# Altium footprint library d1_PcbLib.PcbLib: 266 footprints (part 14 of 17)
Each footprint in its own frame and in the unit in brackets; x right, y up, seen from the top. Pads: shape width x height; smd on the part's side, far side on the other; paste and mask are expansions set on the pad; w line width, h text height; cw(c..) or ccw(c..) is an arc to the next point about the centre after c.
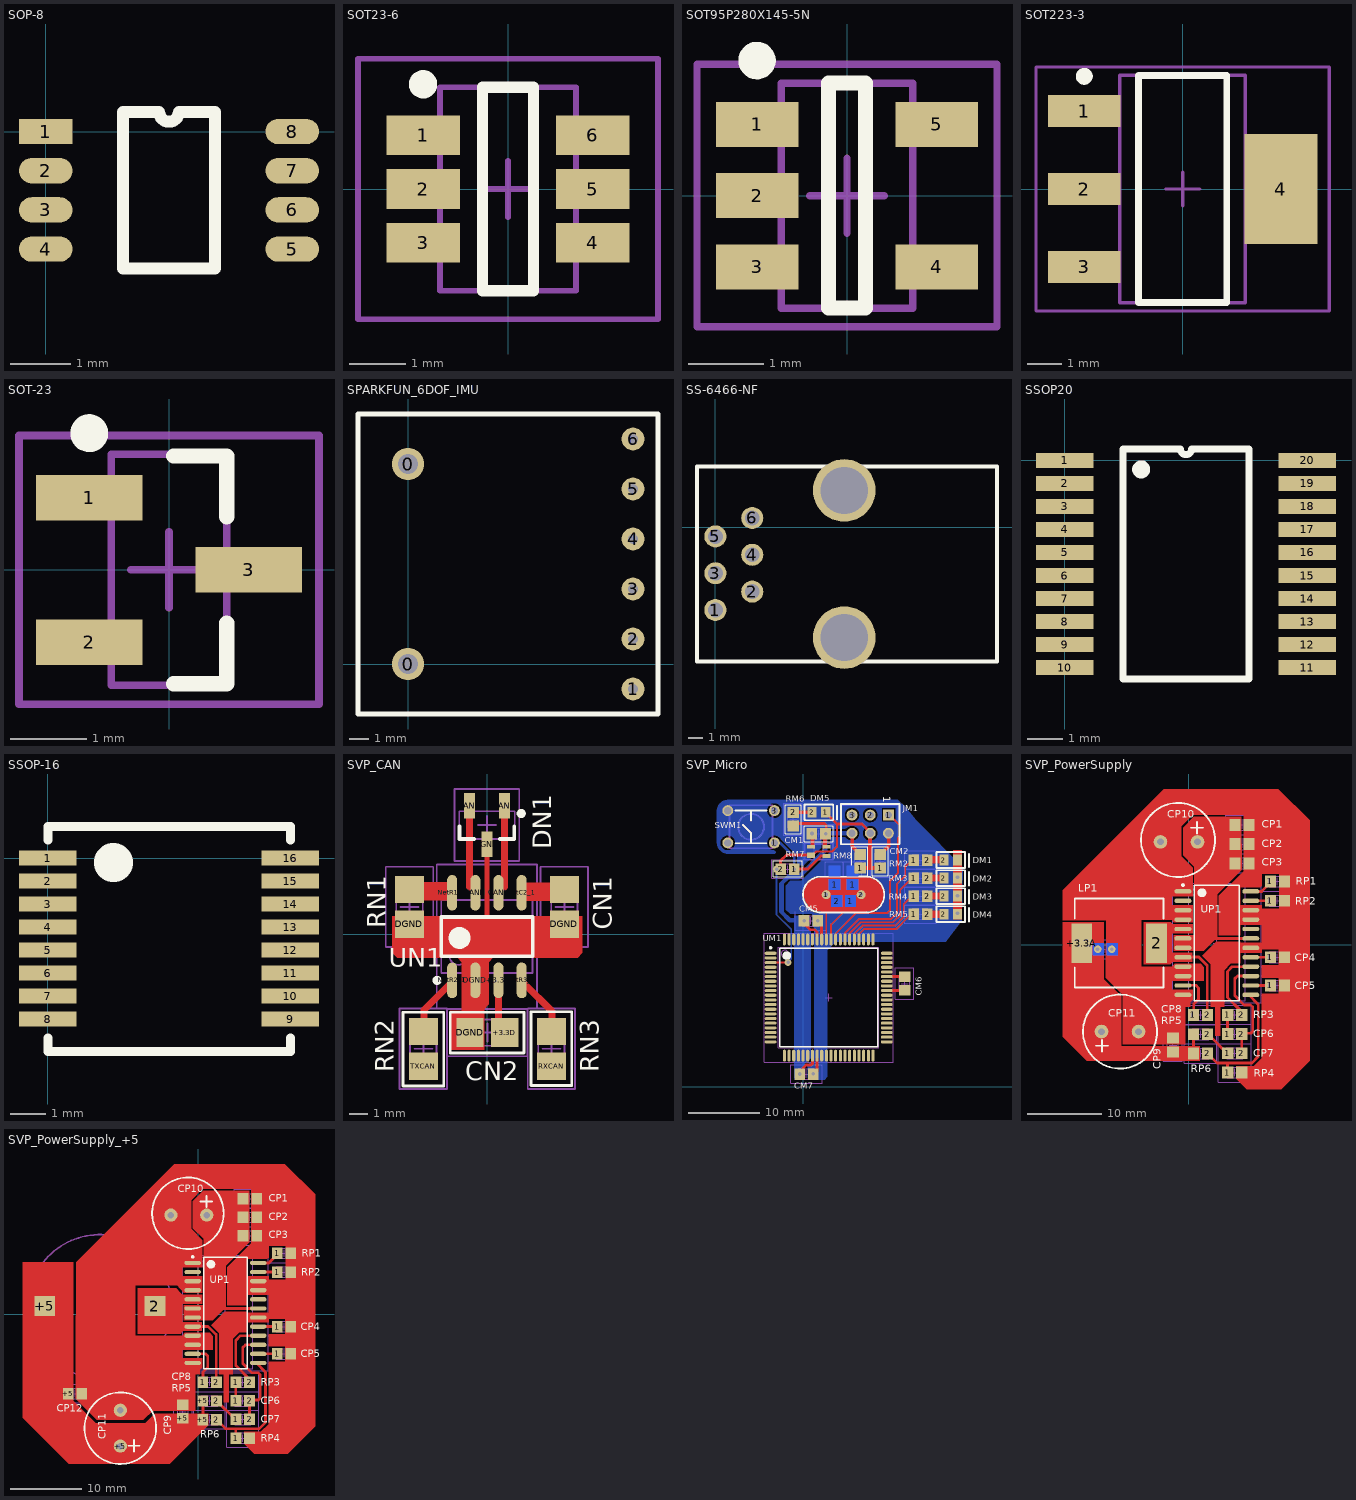
[diagram p13: the footprints below, top view; thin cyan lines are the x and y axes]

## SOP-8 [mm]
pads (8):
  rect 0.889x0.42 smd: 1(0,0)
  oval 0.889x0.42 smd: 2(0,-0.65) 3(0,-1.3) 4(0,-1.95) 5(4.089,-1.95) 6(4.089,-1.3) 7(4.089,-0.65) 8(4.089,0)
Top Overlay:
  lines w0.2: 1.279,-2.275 1.279,0.325 1.882,0.325 ccw(c2.044,0.325) 2.207,0.325 2.81,0.325 2.81,-2.275 1.279,-2.275

## SOT23-6 [mm]
pads (6):
  rect 1.3x0.7 smd: 1(-1.5,0.95) 2(-1.5,0) 3(-1.5,-0.95) 4(1.5,-0.95) 5(1.5,0) 6(1.5,0.95)
Top Overlay:
  circle w0.25: c-1.5,1.85 r0.125
  lines w0.2: -0.45,-1.8 -0.45,1.8 0.45,1.8 0.45,-1.8 -0.45,-1.8
Mechanical 13:
  lines w0.1: -1.2,-1.8 1.2,-1.8 1.2,1.8 -1.2,1.8 -1.2,-1.8
Mechanical 15:
  lines w0.1: -0.5,0 0.5,0 ; 0,-0.5 0,0.5 ; -2.65,-2.3 2.65,-2.3 2.65,2.3 -2.65,2.3 -2.65,-2.3
3D body: height 0, standoff 0, extent -1.2,-1.8 1.2,1.8

## SOT95P280X145-5N [mm] "SOT23, 5-Leads, Body 3.0x3.0mm (max), Pitch 0.95mm, IPC Medium Density"
height 1.45
pads (5):
  rect 1.1x0.6 smd: 1(-1.2,0.95) 2(-1.2,0) 3(-1.2,-0.95) 4(1.2,-0.95) 5(1.2,0.95)
Top Overlay:
  circle w0.25: c-1.2,1.8 r0.125
  lines w0.2: -0.25,-1.5 -0.25,1.5 0.25,1.5 0.25,-1.5 -0.25,-1.5
Mechanical 13:
  lines w0.1: -0.875,-1.5 0.875,-1.5 0.875,1.5 -0.875,1.5 -0.875,-1.5
Mechanical 15:
  lines w0.1: -0.5,0 0.5,0 ; 0,-0.5 0,0.5 ; -2,-1.75 2,-1.75 2,1.75 -2,1.75 -2,-1.75
3D body: height 1.45, standoff 0.05, extent -0.875,-1.5 0.875,1.5

## SOT223-3 [mm] "SOT223, 4-Leads, Body 6.7x7.3mm (max), Pitch 2.30mm, IPC Medium Density"
height 1.8
pads (4):
  rect 2.15x0.95 smd: 1(-2.9,2.3) 2(-2.9,0) 3(-2.9,-2.3)
  rect 2.15x3.25 smd: 4(2.9,0)
Top Overlay:
  circle w0.25: c-2.9,3.325 r0.125
  lines w0.2: -1.3,-3.35 -1.3,3.35 1.3,3.35 1.3,-3.35 -1.3,-3.35
Mechanical 13:
  lines w0.1: -1.85,-3.35 -1.85,3.35 1.85,3.35 1.85,-3.35 -1.85,-3.35
Mechanical 15:
  lines w0.1: -0.5,0 0.5,0 ; 0,-0.5 0,0.5 ; -4.325,-3.6 -4.325,3.6 4.325,3.6 4.325,-3.6 -4.325,-3.6
3D body: height 1.8, standoff 0.02, extent -1.85,-3.35 1.85,3.35

## SOT-23 [mm] "SOT23, 3-Leads, Body 3.0x2.7mm (max), Pitch 0.95mm, IPC Medium Density"
height 1.12
pads (3):
  rect 1.4x0.6 smd: 1(-1.05,0.95) 2(-1.05,-0.95) 3(1.05,0)
Top Overlay:
  circle w0.25: c-1.05,1.8 r0.125
  lines w0.2: 0.06,-1.5 0.76,-1.5 0.76,-0.7 ; 0.06,1.5 0.76,1.5 0.76,0.7
Mechanical 13:
  lines w0.1: -0.76,-1.52 0.76,-1.52 0.76,1.52 -0.76,1.52 -0.76,-1.52
Mechanical 15:
  lines w0.1: -0.5,0 0.5,0 ; 0,-0.5 0,0.5 ; -1.975,-1.77 1.975,-1.77 1.975,1.77 -1.975,1.77 -1.975,-1.77
3D body: height 1.1, standoff 0, extent -1.21,-1.1 0.991,1.1

## SPARKFUN_6DOF_IMU [mm] "SPARKFUN_6DOF_IMU"
pads (8):
  round 1.65 hole 1.02: 0(0,0) 0(0,10.16)
  round 1.16 hole 0.508: 1(11.43,-1.27) 2(11.43,1.27) 3(11.43,3.81) 4(11.43,6.35) 5(11.43,8.89) 6(11.43,11.43)
Top Overlay:
  lines w0.254: -2.54,-2.54 12.7,-2.54 12.7,12.7 -2.54,12.7 -2.54,-2.54
Mechanical 2:
  text ".Designator" at 4.953,10.287 h1.52
3D body: height 2.29, standoff 0, extent -2.413,-2.413 12.573,12.573

## SS-6466-NF [mil]
pads (8):
  round 60 hole 40: 1(0,-225) 2(100,-175) 3(0,-125) 4(100,-75) 5(0,-25) 6(100,25)
  round 170 hole 128: ""(350,-300) ""(350,100)
Top Overlay:
  lines w10: -50,-365 765,-365 765,-100 765,165 -50,165 -50,-365
3D body: height 505, standoff 0, extent -47.5,-365 767.5,165

## SSOP20 [mm]
pads (20):
  rect 1.62x0.42 smd: 1(0,0) 2(0,-0.65) 3(0,-1.3) 4(0,-1.95) 5(0,-2.6) 6(0,-3.25) 7(0,-3.9) 8(0,-4.55) 9(0,-5.2) 10(0,-5.85) 11(6.85,-5.85) 12(6.85,-5.2) 13(6.85,-4.55) 14(6.85,-3.9) 15(6.85,-3.25) 16(6.85,-2.6) 17(6.85,-1.95) 18(6.85,-1.3) 19(6.85,-0.65) 20(6.85,0)
Top Overlay:
  circle w0.254: c2.159,-0.254 r0.127
  lines w0.2: 1.645,-6.175 1.645,0.325 3.263,0.325 ccw(c3.425,0.325) 3.587,0.325 5.205,0.325 5.205,-6.175 1.645,-6.175

## SSOP-16 [mm] "SSOP - 16 Pin"
pads (16):
  rect 1.63x0.42 smd: 1(0,0) 2(0,-0.65) 3(0,-1.3) 4(0,-1.95) 5(0,-2.6) 6(0,-3.25) 7(0,-3.9) 8(0,-4.55) 9(6.85,-4.55) 10(6.85,-3.9) 11(6.85,-3.25) 12(6.85,-2.6) 13(6.85,-1.95) 14(6.85,-1.3) 15(6.85,-0.65) 16(6.85,0)
Top Overlay:
  circle w1: c1.855,-0.127 r0.05
  lines w0.254: 0,-5.08 0,-5.461 6.858,-5.461 6.858,-5.08 ; 0,0.508 0,0.889 6.858,0.889 6.858,0.508

## SVP_CAN [mm]
pads (21):
  oval 0.55x1.95 smd: +3.3D(0.61,-2.527) CANH(-0.66,2.273) CANL(0.61,2.273) DGND(-0.66,-2.527) NetC2_1(1.88,2.273) NetR1_2(-1.93,2.273) NetR2_1(-1.93,-2.527) NetR3_1(1.88,-2.527)
  rect 1.5x1.6 smd: +3.3D(0.95,-5.385) DGND(-0.95,-5.385)
  rect 0.6x1.4 smd: CANH(-0.975,7.028) CANL(0.925,7.028) DGND(-0.025,4.928)
  rect 1.6x1.5 smd: DGND(-4.267,0.549) DGND(4.216,0.549) NetC2_1(4.216,2.449) NetR1_2(-4.267,2.449) NetR2_1(-3.505,-5.324) NetR3_1(3.505,-5.324) RXCAN(3.505,-7.224) TXCAN(-3.505,-7.224)
Top Layer:
  region: -5.207,0.991 5.207,0.991 5.207,-1.016 4.953,-1.295 0.279,-1.295 0.076,-1.524 0.076,-3.835 -0.178,-4.115 -0.178,-6.325 -2.032,-6.35 -2.032,-4.191 -1.397,-4.191 -1.397,-1.524 -1.626,-1.295 -4.928,-1.295 -5.207,-1.016
  lines w0.254: -1.905,-2.718 -1.905,-2.515 ; -0.025,0.61 -0.025,4.928
  lines w0.381: -3.48,-5.309 -3.48,-4.14 -2.057,-2.718 ; -0.975,2.588 -0.975,7.028 ; 0.61,-5.283 0.61,-3.048 ; 0.925,2.588 0.925,7.028 ; 1.981,-2.667 3.531,-4.216 3.531,-5.309
  lines w1.016: -4.47,2.362 -2.184,2.362 ; 2.21,2.337 4.343,2.337
Top Overlay:
  circle w0.25: c1.851,6.613 r0.125
  circle w0.25: c-2.755,-2.527 r0.125
  circle w0.6: c-1.525,-0.202 r0.3
  lines w0.152: -4.623,-8.306 -4.623,-4.267 -2.388,-4.267 -2.388,-8.306 -4.623,-8.306 ; -2.032,-6.502 -2.032,-4.267 2.007,-4.267 2.007,-6.502 -2.032,-6.502 ; 2.388,-8.28 2.388,-4.242 4.623,-4.242 4.623,-8.28 2.388,-8.28
  lines w0.2: -1.525,5.918 -1.525,5.218 -0.725,5.218 ; 0.675,5.218 1.475,5.218 1.475,5.918 ; -2.525,-1.202 2.475,-1.202 2.475,0.948 -2.525,0.948 -2.525,-1.202
  text "DN1" at 3.505,4.648 h1.02
  text "UN1" at -5.41,-1.778 h1.02
  text "CN2" at -1.219,-8.001 h1.02
  text "RN3" at 6.096,-7.569 h1.02
  text "RN2" at -5.131,-7.569 h1.02
  text "CN1" at 6.807,0.254 h1.02
  text "RN1" at -5.563,0.33 h1.02
Mechanical 13:
  circle w0.1: c-1.575,-1.177 r0.5
  lines w0.1: -4.992,0.399 -3.542,0.399 -3.542,2.599 -4.992,2.599 -4.992,0.399 ; -4.23,-7.374 -2.78,-7.374 -2.78,-5.174 -4.23,-5.174 -4.23,-7.374 ; -2.525,-2.127 2.475,-2.127 2.475,1.873 -2.525,1.873 -2.525,-2.127 ; -1.545,5.218 -1.545,6.738 1.495,6.738 1.495,5.218 -1.545,5.218 ; -1.1,-6.11 -1.1,-4.66 1.1,-4.66 1.1,-6.11 -1.1,-6.11 ; 2.78,-7.374 4.23,-7.374 4.23,-5.174 2.78,-5.174 2.78,-7.374 ; 3.491,0.399 4.941,0.399 4.941,2.599 3.491,2.599 3.491,0.399
Mechanical 15:
  lines w0.1: -4.767,1.499 -3.767,1.499 ; -4.267,0.999 -4.267,1.999 ; -4.005,-6.274 -3.005,-6.274 ; -3.505,-6.774 -3.505,-5.774 ; -0.525,-0.127 0.475,-0.127 ; -0.525,5.978 0.475,5.978 ; -0.5,-5.385 0.5,-5.385 ; -0.025,-0.627 -0.025,0.373 ; -0.025,5.478 -0.025,6.478 ; 0,-5.885 0,-4.885 ; 3.005,-6.274 4.005,-6.274 ; 3.505,-6.774 3.505,-5.774 ; 3.716,1.499 4.716,1.499 ; 4.216,0.999 4.216,1.999 ; -5.567,-0.701 -2.967,-0.701 -2.967,3.699 -5.567,3.699 -5.567,-0.701 ; -4.805,-8.474 -2.205,-8.474 -2.205,-4.074 -4.805,-4.074 -4.805,-8.474 ; -2.775,-4.077 2.725,-4.077 2.725,3.823 -2.775,3.823 -2.775,-4.077 ; -2.2,-6.685 -2.2,-4.085 2.2,-4.085 2.2,-6.685 -2.2,-6.685 ; -1.795,4.003 -1.795,7.953 1.745,7.953 1.745,4.003 -1.795,4.003 ; 2.205,-8.474 4.805,-8.474 4.805,-4.074 2.205,-4.074 2.205,-8.474 ; 2.916,-0.701 5.516,-0.701 5.516,3.699 2.916,3.699 2.916,-0.701
3D body: height 1.1, standoff 0, extent -1.125,4.987 1.074,7.188
3D body: height 0.5, standoff -0.01, extent -5.029,-0.025 -3.505,3.023
3D body: height 0.5, standoff -0.01, extent 2.743,-7.798 4.267,-4.75
3D body: height 0.5, standoff -0.01, extent -4.267,-7.798 -2.743,-4.75
3D body: height 1.24, standoff -0.03, extent 3.454,-0.152 4.978,3.15
3D body: height 1.24, standoff -0.03, extent -1.651,-6.147 1.651,-4.623
3D body: height 1.55, standoff 0, extent -2.489,-3.102 2.454,2.898

## SVP_Micro [mil] "Micro, Clock, BDM, Reset, Debug"
pads (136):
  round 60 hole 40: 1(-159,1339) 3(-159,1516.17) DGND(-414.91,1516.17) SW_4(-414.91,1339)
  rect 59.06x62.99 smd: 1(-49.6,1195) 1(605.6,948) 1(605.6,1047) 1(605.6,1146) 1(605.6,1245) 2(-124.4,1195) 2(680.4,948) 2(680.4,1047) 2(680.4,1146) 2(680.4,1245) +3.3D(-20.4,70) +3.3D(3.6,911) +3.3D(121.4,1390) DGND(46.6,1390) DGND(54.4,70) DGND(78.4,911)
  rect 51.18x59.06 smd: 1(122.4,1507) 2(47.6,1507) 2(771.6,948) 2(771.6,1047) 2(771.6,1146) 2(771.6,1245) DGND(846.4,948) DGND(846.4,1047) DGND(846.4,1146) DGND(846.4,1245)
  round 49.21 hole 21.65: 1(125,1055) 2(317.13,1055)
  rect 62.99x59.06 smd far side: 1(171,1110.6) 1(270,1110.6) DGND(171,1185.4) DGND(270,1185.4)
  rect 59.06x62.99 smd far side: 1(258.4,1020) 2(183.6,1020)
  rect 62.99x59.06 smd: 1(311,1200.6) 1(421,1200.6) 2(-56,1506.4) +3.3A(556,529.6) +3.3D(-56,1431.6) +3.3D(311,1275.4) AGND(556,604.4) DGND(421,1275.4)
  rect 60x60 hole 39: 1(467,1492)
  rrect25% 45x30 smd: 2(42,1272)
  round 60 hole 39: 2(367,1492) 3(267,1492) +3.3D(267,1392) BDM_5(367,1392) DGND(467,1392)
  rrect25% 45x20 smd: 3(127,1267) +3.3D(127,1317) DGND(42,1317)
  oval 65x17 smd: 5(-179.9,630.75) 6(-179.9,605.16) 7(-179.9,579.57) 8(-179.9,553.98) 9(-179.9,528.39) 10(-179.9,502.8) 11(-179.9,477.2) 12(-179.9,451.61) 13(-179.9,426.02) 14(-179.9,400.43) 15(-179.9,374.84) 16(-179.9,349.25) 17(-179.9,323.66) 18(-179.9,298.07) 19(-179.9,272.48) 20(-179.9,246.89) 41(457.9,246.89) 42(457.9,272.48) 43(457.9,298.07) 44(457.9,323.66) 45(457.9,349.25) 46(457.9,374.84) 47(457.9,400.43) 48(457.9,426.02) 49(457.9,451.61) 50(457.9,477.2) 51(457.9,502.8) 53(457.9,553.98) 54(457.9,579.57) 56(457.9,630.75) 57(457.9,656.34) 58(457.9,681.93) 59(457.9,707.52) 60(457.9,733.11) +3.3A(457.9,528.39) AGND(457.9,605.16) U_1(-179.9,733.11) U_2(-179.9,707.52) U_3(-179.9,681.93) U_4(-179.9,656.34)
  oval 17x65 smd: 21(-104.11,171.1) 22(-78.52,171.1) 23(-52.93,171.1) 24(-27.34,171.1) 25(-1.75,171.1) 26(23.84,171.1) 29(100.61,171.1) 30(126.2,171.1) 31(151.8,171.1) 32(177.39,171.1) 33(202.98,171.1) 34(228.57,171.1) 35(254.16,171.1) 36(279.75,171.1) 37(305.34,171.1) 38(330.93,171.1) 39(356.52,171.1) 40(382.11,171.1) 61(382.11,808.9) 62(356.52,808.9) 63(330.93,808.9) 64(305.34,808.9) 65(279.75,808.9) 66(254.16,808.9) 67(228.57,808.9) 68(202.98,808.9) 69(177.39,808.9) 70(151.8,808.9) 71(126.2,808.9) 74(49.43,808.9) 75(23.84,808.9) 76(-1.75,808.9) 77(-27.34,808.9) 78(-52.93,808.9) 79(-78.52,808.9) 80(-104.11,808.9) +3.3D(49.43,171.1) +3.3D(75.02,808.9) DGND(75.02,171.1) DGND(100.61,808.9)
via -147,1194 diameter 40 hole 20
via -84,683 diameter 40 hole 20
via 55,72 diameter 40 hole 20
via -20,70 diameter 40 hole 20
via 4,912 diameter 40 hole 20
via 78,912 diameter 40 hole 20
via 122,1389 diameter 40 hole 20
via 47,1391 diameter 40 hole 20
via -50,1195 diameter 40 hole 20
via 846,952 diameter 40 hole 20
via 846,1048 diameter 40 hole 20
via 846,1150 diameter 40 hole 20
Top Layer:
  rectangle: 821,918 872,1300
  pour cut-out: 23,1114 31,1123 37,1128 47,1136 57,1141 68,1146 83,1149 94,1150 352,1150 368,1147 384,1142 397,1135 410,1125 424,1109 434,1091 439,1076 441,1060 441,1048 438,1033 431,1016 423,1002 408,985 395,976 376,967 362,964 345,962 98,962 85,963 75,965 65.87,967.74 56,972 46,977 38,983 29,992 21,1002 12,1015 7,1029 4,1044 3,1056 4,1068 6,1078 9,1090 14,1099 18,1106
  lines w10: -179,683 -83,683 ; 126,822 126,853 126,1054 ; 152,831 152,850 ; 152,851 152,891 316,1055 ; 175,835 175,839 291,955 461,955 476,970 476,1131 520,1175 520,1366 527,1373 527,1439 478,1488 ; 201,831 201,836 ; 228,838 228,833 228,839 228,840 228,843 307,922 482,922 514,954 514,1114 559,1159 559,1207 592,1240 ; 253,833 253,840 253,841 315,903 492,903 532,943 532,1082 587,1137 ; 279,834 279,839 325,885 503,885 551,933 551,1002 601,1052 ; 304,835 305,836 306,836 306,839 333,866 510,866 579,935 585,935 ; 367,1393 367,1397
  lines w12: 52,1273 71,1292 158,1292 184,1318 184,1444
  lines w15: -125,1196 -125,1241 -93,1273 -26,1273 40,1273 ; -51,1196 25,1196 42,1213 ; -43,1446 115,1446 126,1435 126,1399 ; 15,892 15,886 39,862 63,862 75,850 75,826 ; 36.5,1207.5 96,1267 121,1267 ; 100,816 100,906 ; 130,1498 185,1443 321,1443 367,1397 ; 455,605 555,605 ; 456,529 561,529
  lines w16: -2,98 -2,102 15,119 42,119 49,126 49,162
  lines w17: 75,85 75,156
  lines w20: -49,1507 48,1507 ; 50,1320 50,1379 ; 119,1319 119,1380 ; 268,1392 268,1319 312,1275 ; 311,1201 420,1201 ; 366,1203 366,1393 ; 421,1275 468,1322 468,1392
  lines w40: 673,1047 766,1047 ; 676,1146 769,1146 ; 681,1246 774,1246 ; 682,948 775,948
Bottom Layer:
  circle w20: c-415,1516 r50
  circle w20: c367,1392 r50
  circle w20: c367,1492 r50
  circle w20: c267,1492 r50
  circle w20: c-415,1339 r50
  circle w20: c-159,1516 r50
  region: 269,1215 168,1215 168,1156 269,1156
  region: 49,942 49,949 -73,949 -96,972 -96,1105 -71,1130 -11,1130 151,1292 151,1170 110,1170 110,1158 79,1156 54,1150 28,1132 6,1106 -2,1085 -7,1064 -6,1039 -2,1021 6,1004 20,986 35,972 50,961 72,954
  pour cut-out: 421,1114 413,1123 407,1128 397,1136 387,1141 376,1146 361,1149 350,1150 92,1150 76,1147 60,1142 47,1135 34,1125 20,1109 10,1091 5,1076 3,1060 3,1048 6,1033 13,1016 21,1002 36,985 49,976 68,967 82,964 99,962 346,962 359,963 369,965 378.13,967.74 388,972 398,977 406,983 415,992 423,1002 432,1015 437,1029 440,1044 441,1056 440,1068 438,1078 435,1090 430,1099 426,1106
  region: 220,1576 518,1576 558,1538 551,1532 389,1532 380,1540 373,1533 233,1533 219,1519
  region: -475,1337 -438,1378 -408,1382 -381,1376 -365,1330 -378,1306 -404,1297 -434,1293 -418,1279 -159,1279 -197,1307 -202,1336 -201,1365 -180,1380 -153,1382 -131,1376 -125,1359 -112,1347 -34,1269 -34,1223 -26,1216 1,1216 98,1313 98,1368 94,1379.33 94,1405 103,1417 231,1417 234,1433 273,1436 306,1428 311,1389 309,1350 324,1350 324,1429.4 371,1435 415,1430 422,1443 632,1450 558,1538 506,1539 506,1454 429,1454 429,1533 403,1533 408,1494 403,1457 365,1451 328,1457 323,1496 333,1535 302,1535 309,1493 303,1455 266,1452 229,1458 221,1576 -159,1576 -135,1551 -122,1540 -116,1525 -118,1486 -136,1476 -166,1474 -195,1478 -208,1526 -159,1576 -419,1576 -475,1521
  region: 25,46 25,121 60,156 60,873 49,884 49,943 66,954 374,954 402,967 422,984 442,1015 449,1044 450,1071 441,1099 422,1127 400,1144 367,1156 353,1158 110,1158 101,1171 147,1217 147,1369 230,1369 250,1354 383,1354 408,1370 408,1430 422,1450 554,1451 629,1454 874,1205 870,913 781,797 179,797 131,749 131,54 116,39 31,39
  region: -51,46 -45,40 2,40 8,46 8,126 40,158 40,860 32,868 32,938 -51,938
  lines w10: -148,1196 -148,946 -67,865 -67,702 -72,697 -84,697 -84,682 ; 125,1055 125,1066 171,1112 ; 126,1054 132,1054 170,1016 ; 204,1003 208,999 ; 234,996 236,998 248,1010 ; 274,1016 313,1055 317,1055 ; 278,1106 318,1066 318,1056
  lines w15: -163,1340 -129,1340 -50,1261 -50,1194
  lines w20: -158.98,1288.71 cw(c-158.5,1338.7) -117.99,1368.01 ; 230.59,1357.73 ccw(c267,1392) 232.73,1428.41
  lines w25: 6,915 -75,915 -120,960 -120,1116 -84,1152 -26,1152 117,1295 121,1299 121,1388 ; 121,1391 264,1391
Top Overlay:
  circle w9.84: c-179.9,763.62 r4.92
  circle w23.62: c-91.31,720.32 r11.81
  lines w6: -166,1152 -166,1240 -7,1240 -7,1152 -166,1152 ; -100,1390 -100,1549 -12,1549 -12,1390 -100,1390 ; 5,1346 5,1434 164,1434 164,1346 5,1346 ; 266,1159 354,1159 354,1318 266,1318 266,1159 ; 377,1159 465,1159 465,1318 377,1318 377,1159
  lines w7.87: -130.69,220.31 -130.69,759.69 408.69,759.69 408.69,220.31 -130.69,220.31
  lines w10: -371.95,1337.58 -201.95,1337.58 ; -371.95,1517.58 -201.95,1517.58 ; -331.95,1437.58 -286.95,1392.58 -286.95,1337.58 ; -286.95,1462.58 -286.95,1517.58 ; 96,1153.43 348,1153.43 ; 96.06,956.57 cw(c96.06,1055) 96.06,1153.43 ; 97,956.57 346,956.57 ; 185,1467 185,1542 ; 346.06,956.57 ccw(c346.06,1055) 346.06,1153.43 ; 909,908 909,983 ; 909,1007 909,1082 ; 909,1106 909,1181 ; 909,1205 909,1280 ; 6.26,1463.69 163.74,1463.69 163.74,1550.31 120.43,1550.31 49.57,1550.31 6.26,1550.31 6.26,1463.69 ; 207,1332 207,1552 527,1552 527,1332 207,1332 ; 730.26,904.69 887.74,904.69 887.74,991.31 844.43,991.31 773.57,991.31 730.26,991.31 730.26,904.69 ; 730.26,1003.69 887.74,1003.69 887.74,1090.31 844.43,1090.31 773.57,1090.31 730.26,1090.31 730.26,1003.69 ; 730.26,1102.69 887.74,1102.69 887.74,1189.31 844.43,1189.31 773.57,1189.31 730.26,1189.31 730.26,1102.69 ; 730.26,1201.69 730.26,1288.31 773.57,1288.31 844.43,1288.31 887.74,1288.31 887.74,1201.69 730.26,1201.69
  text "SWM1" at -487,1419 h35
  text "UM1" at -222,798 h35
  text "CM7" at -49,-12 h35
  text "CM6" at 649,501 h35
  text "CM5" at -24,960 h35
  text "CM2" at 473,1278 h35
  text "CM1" at -101,1338 h35
  text "RM8" at 163,1252 h35
  text "RM7" at -98,1260 h35
  text "RM6" at -96,1566 h35
  text "JM1" at 546,1513 h35
  text "RM5" at 471,930 h35
  text "RM4" at 469,1027 h35
  text "RM3" at 470,1129 h35
  text "RM2" at 472,1208 h35
  text "DM5" at 37,1567 h35
  text "DM4" at 931,927 h35
  text "DM3" at 931,1028 h35
  text "DM2" at 931,1127 h35
  text "DM1" at 931,1226 h35
  text "1" at 438,1595 h40
Bottom Overlay:
  lines w6: 129,1065 129,1224 217,1224 217,1065 129,1065 ; 142,977 142,1065 301,1065 301,977 142,977 ; 227,1065 227,1224 315,1224 315,1065 227,1065
  text "CM3" at 332,1247 h35
  text "RM9" at 259,925 h35
  text "CM4" at 203,1246 h35
Mechanical 13:
  circle w10: c-286.95,1427.58 r70.87
  circle w3.94: c-101.16,730.16 r19.68
  lines w3.94: -136.59,214.41 -136.59,765.59 414.59,765.59 414.59,214.41 -136.59,214.41 ; -130.31,1166.46 -130.31,1223.54 -43.69,1223.54 -43.69,1166.46 -130.31,1166.46 ; -84.54,1425.69 -27.46,1425.69 -27.46,1512.31 -84.54,1512.31 -84.54,1425.69 ; -26.31,41.46 60.31,41.46 60.31,98.54 -26.31,98.54 -26.31,41.46 ; -2.31,882.46 -2.31,939.54 84.31,939.54 84.31,882.46 -2.31,882.46 ; 40.69,1361.46 40.69,1418.54 127.31,1418.54 127.31,1361.46 40.69,1361.46 ; 142.46,1104.69 199.54,1104.69 199.54,1191.31 142.46,1191.31 142.46,1104.69 ; 177.69,991.46 264.31,991.46 264.31,1048.54 177.69,1048.54 177.69,991.46 ; 241.46,1104.69 298.54,1104.69 298.54,1191.31 241.46,1191.31 241.46,1104.69 ; 282.46,1194.69 282.46,1281.31 339.54,1281.31 339.54,1194.69 282.46,1194.69 ; 392.46,1194.69 392.46,1281.31 449.54,1281.31 449.54,1194.69 392.46,1194.69 ; 527.46,523.69 527.46,610.31 584.54,610.31 584.54,523.69 527.46,523.69 ; 599.69,919.46 686.31,919.46 686.31,976.54 599.69,976.54 599.69,919.46 ; 599.69,1018.46 686.31,1018.46 686.31,1075.54 599.69,1075.54 599.69,1018.46 ; 599.69,1117.46 686.31,1117.46 686.31,1174.54 599.69,1174.54 599.69,1117.46 ; 599.69,1216.46 599.69,1273.54 686.31,1273.54 686.31,1216.46 599.69,1216.46
  lines w5: 60,1252.26 109.21,1252.26 109.21,1331 60,1331 60,1252.26 ; 212,1337 212,1547 522,1547 522,1337 212,1337 ; 254.5,1379.5 279.5,1379.5 279.5,1404.5 254.5,1404.5 254.5,1379.5 ; 254.5,1479.5 279.5,1479.5 279.5,1504.5 254.5,1504.5 254.5,1479.5 ; 354.5,1379.5 379.5,1379.5 379.5,1404.5 354.5,1404.5 354.5,1379.5 ; 354.5,1479.5 379.5,1479.5 379.5,1504.5 354.5,1504.5 354.5,1479.5 ; 454.5,1379.5 454.5,1404.5 479.5,1404.5 479.5,1379.5 454.5,1379.5 ; 454.5,1479.5 479.5,1479.5 479.5,1504.5 454.5,1504.5 454.5,1479.5
  lines w10: -405.06,1309.47 -168.84,1309.47 -168.84,1545.69 -405.06,1545.69 -405.06,1309.47
Mechanical 15:
  lines w3.94: -106.69,1195 -67.31,1195 ; -87,1175.31 -87,1214.68 ; -75.69,1469 -36.32,1469 ; -56,1449.32 -56,1488.69 ; -45.61,962.18 -45.61,859.82 127.61,859.82 127.61,962.18 ; -2.69,70 36.69,70 ; 17,50.32 17,89.69 ; 21.31,911 60.69,911 ; 41,891.31 41,930.68 ; 64.31,1390 103.69,1390 ; 84,1370.31 84,1409.68 ; 119.31,490 158.69,490 ; 139,470.31 139,509.69 ; 151.32,1148 190.69,1148 ; 171,1128.32 171,1167.69 ; 201.31,1020 240.69,1020 ; 221,1000.32 221,1039.69 ; 250.32,1148 289.69,1148 ; 270,1128.32 270,1167.69 ; 291.31,1238 330.68,1238 ; 311,1218.32 311,1257.69 ; 401.31,1238 440.68,1238 ; 421,1218.32 421,1257.69 ; 536.31,567 575.68,567 ; 556,547.32 556,586.69 ; 623.32,948 662.69,948 ; 623.32,1047 662.69,1047 ; 623.32,1146 662.69,1146 ; 623.32,1245 662.69,1245 ; 643,928.32 643,967.69 ; 643,1027.32 643,1066.69 ; 643,1126.32 643,1165.69 ; 643,1225.32 643,1264.69 ; -215.33,135.67 -215.33,844.33 493.33,844.33 493.33,135.67 -215.33,135.67 ; -173.61,1143.82 -173.61,1246.18 -0.39,1246.18 -0.39,1143.82 -173.61,1143.82 ; -107.18,1382.39 -4.82,1382.39 -4.82,1555.61 -107.18,1555.61 -107.18,1382.39 ; -69.61,18.82 103.61,18.82 103.61,121.18 -69.61,121.18 -69.61,18.82 ; -2.61,1338.82 -2.61,1441.18 170.61,1441.18 170.61,1338.82 -2.61,1338.82 ; 119.82,1061.39 222.18,1061.39 222.18,1234.61 119.82,1234.61 119.82,1061.39 ; 134.39,968.82 307.61,968.82 307.61,1071.18 134.39,1071.18 134.39,968.82 ; 218.82,1061.39 321.18,1061.39 321.18,1234.61 218.82,1234.61 218.82,1061.39 ; 259.82,1151.39 259.82,1324.61 362.18,1324.61 362.18,1151.39 259.82,1151.39 ; 369.82,1151.39 369.82,1324.61 472.18,1324.61 472.18,1151.39 369.82,1151.39 ; 504.82,480.39 504.82,653.61 607.18,653.61 607.18,480.39 504.82,480.39 ; 556.39,896.82 729.61,896.82 729.61,999.18 556.39,999.18 556.39,896.82 ; 556.39,995.82 729.61,995.82 729.61,1098.18 556.39,1098.18 556.39,995.82 ; 556.39,1094.82 729.61,1094.82 729.61,1197.18 556.39,1197.18 556.39,1094.82 ; 556.39,1193.82 556.39,1296.18 729.61,1296.18 729.61,1193.82 556.39,1193.82
  lines w10: 7,1247 162,1247 162,1337 7,1337 7,1247
3D body: height 19.5, standoff -0.5, extent 161,990 281,1050
3D body: height 49, standoff -1, extent 240,1082 300,1212
3D body: height 49, standoff -1, extent 141,1082 201,1212
3D body: height 130, standoff -30, extent -3,985 443.85,1128.7
3D body: height 49, standoff -1, extent -24,881 106,941
3D body: height 49, standoff -1, extent -48,40 82,100
3D body: height 49, standoff -1, extent 526,502 586,632
3D body: height 49, standoff -1, extent 391,1173 451,1303
3D body: height 49, standoff -1, extent 19,1360 149,1420
3D body: height 19.5, standoff -0.5, extent 281,1178 341,1298
3D body: height 19.5, standoff -0.5, extent 583,918 703,978
3D body: height 19.5, standoff -0.5, extent 583,1017 703,1077
3D body: height 19.5, standoff -0.5, extent 583,1116 703,1176
3D body: height 19.5, standoff -0.5, extent 583,1216 703,1276
3D body: height 19.5, standoff -0.5, extent -147,1165 -27,1225
3D body: height 19.5, standoff -0.5, extent -87,1410 -27,1530
3D body: height 62.56, standoff 0.13, extent -176,174.72 454.28,805
3D body: height 169, standoff -25, extent -413.39,1309 -158,1545
3D body: height 100, standoff 0, extent 212.02,1337.02 521.98,1546.98
3D body: height 418, standoff -120, extent 354.52,1479.52 379.48,1504.48
3D body: height 418, standoff -120, extent 454.52,1479.52 479.48,1504.48
3D body: height 418, standoff -120, extent 254.52,1379.52 279.48,1404.48
3D body: height 418, standoff -120, extent 354.52,1379.52 379.48,1404.48
3D body: height 418, standoff -120, extent 454.52,1379.52 479.48,1404.48
3D body: height 418, standoff -120, extent 254.52,1479.52 279.48,1504.48
3D body: height 31, standoff 0, extent 769,1220 848,1269
3D body: height 31, standoff 0, extent 45,1482 124,1531
3D body: height 31, standoff 0, extent 769,1121 848,1170
3D body: height 31, standoff 0, extent 769,1022 848,1071
3D body: height 31, standoff 0, extent 769,923 848,972
3D body: height 42.69, standoff -0.62, extent 41,1253.63 127.61,1332.37

## SVP_PowerSupply [mm]
pads (62):
  rect 1.5x1.6 smd: 1(0.625,-9.474) 1(5.248,-17.272) 1(5.248,-14.656) 1(5.248,-12.065) 1(5.248,-9.474) 1(11.013,-5.512) 1(11.013,-1.702) 1(11.013,5.918) 1(11.013,8.534) 2(2.525,-14.681) 2(2.525,-12.09) 2(2.525,-9.474) 2(7.148,-14.656) 2(7.148,-12.065) 2(7.148,-9.474) +3.3A(0.625,-14.681) +3.3A(0.625,-12.09) +12P(6.238,10.973) +12P(6.238,13.564) +12P(6.238,16.154) AGND(7.148,-17.272) AGND(8.138,10.973) AGND(8.138,13.564) AGND(8.138,16.154) AGND(12.913,-5.512) AGND(12.913,-1.702) AGND(12.913,5.918) AGND(12.913,8.534)
  rect 2.8x5.3 smd: 2(-4.348,0.203) +3.3A(-14.448,0.203)
  oval 2.3x0.6 smd: 2(-0.79,5.918) 5(-0.79,2.108) 8(-0.79,-1.702) 11(-0.79,-5.512) 13(8.36,-6.782) 14(8.36,-5.512) 15(8.36,-4.242) 16(8.36,-2.972) 17(8.36,-1.702) 20(8.36,2.108) 23(8.36,5.918) 24(8.36,7.188) +12P(-0.79,-0.432) +12P(-0.79,0.838) +12P(8.36,0.838) AGND(-0.79,-6.782) AGND(-0.79,-4.242) AGND(-0.79,-2.972) AGND(-0.79,3.378) AGND(-0.79,4.648) AGND(-0.79,7.188) AGND(8.36,-0.432) AGND(8.36,3.378) AGND(8.36,4.648)
  rect 1.5x1.6 smd far side: +3.3A(-12.228,-0.61) AGND(-10.328,-0.61)
  round 1.85 hole 0.9: +3.3A(-11.786,-11.735) +12P(1.168,13.868) AGND(-6.786,-11.735) AGND(-3.832,13.868)
  rect 1.6x1.5 smd: +3.3A(-2.159,-14.514) AGND(-2.159,-12.614)
via -12.319,-0.61 diameter 1.016 hole 0.508
via -10.389,-0.61 diameter 1.016 hole 0.508
Top Layer:
  rectangle: -11.786,-15.697 1.473,-13.691
  rectangle: 12.167,4.724 16.332,10.185
  rectangle: -6.1,-2.65 -2.5,3.05
  region: -8.89,-13.437 -8.89,-6.782 -11.201,-4.47 -11.176,3.302 -17.043,3.302 -17.043,7.315 -3.353,21.006 12.09,21.006 16.332,16.789 16.332,9.601 9.83,9.601 9.83,7.925 9.652,7.772 6.909,7.772 6.909,5.334 9.83,5.334 9.83,4.826 16.332,4.826 16.307,-15.646 12.471,-19.482 7.798,-19.482 6.401,-18.085 6.401,-16.408 8.738,-16.408 9.83,-15.316 9.83,-6.604 12.167,-6.604 12.167,-4.445 9.83,-4.445 9.83,-2.769 12.167,-2.769 12.167,-0.635 9.83,-0.635 9.83,-1.118 6.909,-1.118 6.909,-2.515 5.69,-2.515 4.775,-3.429 4.775,-8.382 4.216,-8.382 4.216,-12.294 3.556,-12.294 3.556,-8.382 2.946,-8.382 2.946,-2.616 1.803,-1.499 3.683,0.381 6.909,0.381 6.909,0.254 9.83,0.254 9.83,2.718 6.909,2.718 6.909,1.295 4.064,1.295 4.064,6.604 7.391,9.931 7.391,17.526 0.533,17.526 -1.016,15.977 -1.016,11.938 0.508,10.363 0.508,6.553 -2.286,6.553 -2.286,5.334 0.508,5.334 0.508,3.023 -2.032,3.023 -2.311,3.353 -6.401,3.353 -6.401,-2.972 -2.286,-2.972 -1.905,-2.591 1.575,-2.591 2.032,-3.023 2.032,-4.902 -2.261,-4.902 -2.286,-4.877 -2.286,-6.096 0.508,-6.096 0.508,-7.442 0.203,-7.747 0.203,-8.382 -0.457,-8.382 -0.457,-13.437
  region: -2.502,-2.65 -2.496,-2.65 -2.15,-2.3 0.45,-2.3 0.45,-1.092 -2.286,-1.092 -2.286,1.524 0.508,1.524 0.508,2.769 -2.184,2.769 -2.464,3.05 -2.503,3.05
  region: -17.043,3.048 -11.455,3.048 -11.455,-4.648 -9.144,-6.96 -9.144,-14.834 -10.033,-15.684 -13.767,-15.684 -17.043,-12.408
  region: 7.087,17.272 7.112,10.084 3.81,6.782 3.81,0.991 2.007,-0.813 -2.032,-0.813 -2.032,1.27 0.762,1.27 0.762,10.541 -0.762,12.065 -0.762,15.799 0.66,17.272
  lines w0.254: 6.604,-8.915 6.604,-8.941 6.706,-8.941
  lines w0.381: -0.178,-6.731 -0.102,-6.807 ; -0.178,-5.486 0.965,-5.486 1.321,-5.842 1.321,-7.366 0.66,-8.026 0.66,-9.398 ; -0.051,0.838 8.357,0.838 ; 0.025,-1.676 1.346,-1.676 2.489,-2.819 2.489,-9.398 ; 0.635,-14.707 0.635,-12.116 ; 2.743,-14.91 3.785,-15.951 8.509,-15.951 9.373,-15.088 9.373,-8.077 8.103,-6.807 ; 2.972,-12.471 4.813,-14.313 ; 5.232,-17.196 5.232,-15.951 ; 5.232,-11.963 5.232,-9.728 ; 7.01,-9.068 7.01,-8.915 5.232,-7.137 5.232,-3.607 5.867,-2.972 8.407,-2.972 ; 7.137,-14.605 7.137,-12.421 ; 7.366,-11.963 8.357,-11.963 8.636,-11.684 8.636,-8.433 8.331,-8.128 7.442,-8.128 6.198,-6.883 6.198,-4.597 6.553,-4.242 7.645,-4.242 ; 9.195,-1.702 10.541,-1.702 ; 9.246,-5.512 10.643,-5.512 ; 9.246,5.918 10.668,5.918 ; 9.246,7.188 9.83,7.188 10.77,8.128
Top Overlay:
  circle w0.254: c-1.459,14.122 r5
  circle w0.6: c1.76,7.003 r0.3
  circle w0.25: c-0.79,8.038 r0.125
  circle w0.254: c-9.286,-11.735 r5
  lines w0.2: 0.76,-7.597 6.81,-7.597 6.81,8.003 0.76,8.003 0.76,-7.597
  lines w0.254: -15.398,-3.097 -15.398,-5.797 -3.398,-5.797 -3.398,-3.097 ; -15.398,3.503 -15.398,6.203 -3.398,6.203 -3.398,3.503 ; -12.548,-13.64 -10.922,-13.64 ; -11.735,-14.427 -11.735,-12.852 ; 0.305,15.773 1.93,15.773 ; 1.118,14.986 1.118,16.561
  text "CP9" at -3.759,-16.789 h1.02
  text "CP1" at 9.83,15.748 h1.02
  text "CP2" at 9.83,13.132 h1.02
  text "CP3" at 9.83,10.617 h1.02
  text "CP4" at 14.326,-2.21 h1.02
  text "CP5" at 14.326,-5.994 h1.02
  text "CP6" at 8.687,-12.522 h1.02
  text "CP7" at 8.687,-15.138 h1.02
  text "CP8" at -3.734,-9.22 h1.02
  text "CP10" at -2.896,17.094 h1.02
  text "CP11" at -10.846,-9.703 h1.02
  text "LP1" at -14.935,7.137 h1.02
  text "UP1" at 1.6,4.318 h1.02
  text "RP1" at 14.402,8.077 h1.02
  text "RP2" at 14.376,5.385 h1.02
  text "RP3" at 8.712,-9.957 h1.02
  text "RP4" at 8.738,-17.805 h1.02
  text "RP5" at -3.734,-10.77 h1.02
  text "RP6" at 0.229,-17.196 h1.02
Bottom Overlay:
  text "CP12" at -12.979,-2.159 h1.02
Mechanical 13:
  circle w0.1: c0.935,7.053 r0.5
  lines w0.1: -12.378,-1.335 -12.378,0.115 -10.178,0.115 -10.178,-1.335 -12.378,-1.335 ; -2.884,-14.664 -2.884,-12.464 -1.434,-12.464 -1.434,-14.664 -2.884,-14.664 ; -0.015,-7.597 7.585,-7.597 7.585,8.003 -0.015,8.003 -0.015,-7.597 ; 0.475,-15.406 0.475,-13.956 2.675,-13.956 2.675,-15.406 0.475,-15.406 ; 0.475,-12.815 0.475,-11.365 2.675,-11.365 2.675,-12.815 0.475,-12.815 ; 0.475,-10.199 0.475,-8.749 2.675,-8.749 2.675,-10.199 0.475,-10.199 ; 5.098,-17.997 5.098,-16.547 7.298,-16.547 7.298,-17.997 5.098,-17.997 ; 5.098,-15.381 5.098,-13.931 7.298,-13.931 7.298,-15.381 5.098,-15.381 ; 5.098,-12.79 5.098,-11.34 7.298,-11.34 7.298,-12.79 5.098,-12.79 ; 5.098,-10.199 5.098,-8.749 7.298,-8.749 7.298,-10.199 5.098,-10.199 ; 6.088,10.248 6.088,11.698 8.288,11.698 8.288,10.248 6.088,10.248 ; 6.088,12.839 6.088,14.289 8.288,14.289 8.288,12.839 6.088,12.839 ; 6.088,15.429 6.088,16.879 8.288,16.879 8.288,15.429 6.088,15.429 ; 10.863,-6.237 10.863,-4.787 13.063,-4.787 13.063,-6.237 10.863,-6.237 ; 10.863,-2.427 10.863,-0.977 13.063,-0.977 13.063,-2.427 10.863,-2.427 ; 10.863,5.193 10.863,6.643 13.063,6.643 13.063,5.193 10.863,5.193 ; 10.863,7.809 10.863,9.259 13.063,9.259 13.063,7.809 10.863,7.809
Mechanical 15:
  lines w0.1: -11.778,-0.61 -10.778,-0.61 ; -11.278,-1.11 -11.278,-0.11 ; -2.659,-13.564 -1.659,-13.564 ; -2.159,-14.064 -2.159,-13.064 ; 1.075,-14.681 2.075,-14.681 ; 1.075,-12.09 2.075,-12.09 ; 1.075,-9.474 2.075,-9.474 ; 1.575,-15.181 1.575,-14.181 ; 1.575,-12.59 1.575,-11.59 ; 1.575,-9.974 1.575,-8.974 ; 3.285,0.203 4.285,0.203 ; 3.785,-0.297 3.785,0.703 ; 5.698,-17.272 6.698,-17.272 ; 5.698,-14.656 6.698,-14.656 ; 5.698,-12.065 6.698,-12.065 ; 5.698,-9.474 6.698,-9.474 ; 6.198,-17.772 6.198,-16.772 ; 6.198,-15.156 6.198,-14.156 ; 6.198,-12.565 6.198,-11.565 ; 6.198,-9.974 6.198,-8.974 ; 6.688,10.973 7.688,10.973 ; 6.688,13.564 7.688,13.564 ; 6.688,16.154 7.688,16.154 ; 7.188,10.473 7.188,11.473 ; 7.188,13.064 7.188,14.064 ; 7.188,15.654 7.188,16.654 ; 11.463,-5.512 12.463,-5.512 ; 11.463,-1.702 12.463,-1.702 ; 11.463,5.918 12.463,5.918 ; 11.463,8.534 12.463,8.534 ; 11.963,-6.012 11.963,-5.012 ; 11.963,-2.202 11.963,-1.202 ; 11.963,5.418 11.963,6.418 ; 11.963,8.034 11.963,9.034 ; -13.478,-1.91 -13.478,0.69 -9.078,0.69 -9.078,-1.91 -13.478,-1.91 ; -3.459,-15.764 -3.459,-11.364 -0.859,-11.364 -0.859,-15.764 -3.459,-15.764 ; -2.19,-7.847 9.76,-7.847 9.76,8.253 -2.19,8.253 -2.19,-7.847 ; -0.625,-15.981 -0.625,-13.381 3.775,-13.381 3.775,-15.981 -0.625,-15.981 ; -0.625,-13.39 -0.625,-10.79 3.775,-10.79 3.775,-13.39 -0.625,-13.39 ; -0.625,-10.774 -0.625,-8.174 3.775,-8.174 3.775,-10.774 -0.625,-10.774 ; 3.998,-18.572 3.998,-15.972 8.398,-15.972 8.398,-18.572 3.998,-18.572 ; 3.998,-15.956 3.998,-13.356 8.398,-13.356 8.398,-15.956 3.998,-15.956 ; 3.998,-13.365 3.998,-10.765 8.398,-10.765 8.398,-13.365 3.998,-13.365 ; 3.998,-10.774 3.998,-8.174 8.398,-8.174 8.398,-10.774 3.998,-10.774 ; 4.988,9.673 4.988,12.273 9.388,12.273 9.388,9.673 4.988,9.673 ; 4.988,12.264 4.988,14.864 9.388,14.864 9.388,12.264 4.988,12.264 ; 4.988,14.854 4.988,17.454 9.388,17.454 9.388,14.854 4.988,14.854 ; 9.763,-6.812 9.763,-4.212 14.163,-4.212 14.163,-6.812 9.763,-6.812 ; 9.763,-3.002 9.763,-0.402 14.163,-0.402 14.163,-3.002 9.763,-3.002 ; 9.763,4.618 9.763,7.218 14.163,7.218 14.163,4.618 9.763,4.618 ; 9.763,7.234 9.763,9.834 14.163,9.834 14.163,7.234 9.763,7.234
3D body: height 1.24, standoff -0.03, extent 5.537,15.392 8.839,16.916
3D body: height 1.24, standoff -0.03, extent 5.537,12.802 8.839,14.326
3D body: height 1.24, standoff -0.03, extent 5.537,10.211 8.839,11.735
3D body: height 1.24, standoff -0.03, extent 10.312,-2.464 13.614,-0.94
3D body: height 1.24, standoff -0.03, extent 10.312,-6.274 13.614,-4.75
3D body: height 1.24, standoff -0.03, extent 4.547,-12.827 7.849,-11.303
3D body: height 1.24, standoff -0.03, extent 4.547,-15.418 7.849,-13.894
3D body: height 1.24, standoff -0.03, extent -2.921,-15.215 -1.397,-11.913
3D body: height 0.5, standoff -0.01, extent 10.439,7.772 13.487,9.296
3D body: height 0.5, standoff -0.01, extent 10.439,5.156 13.487,6.68
3D body: height 0.5, standoff -0.01, extent 4.674,-10.236 7.722,-8.712
3D body: height 0.5, standoff -0.01, extent 4.674,-18.034 7.722,-16.51
3D body: height 0.5, standoff -0.01, extent 0.051,-15.443 3.099,-13.919
3D body: height 0.5, standoff -0.01, extent 0.051,-12.852 3.099,-11.328
3D body: height 1.24, standoff -0.03, extent -0.076,-10.236 3.226,-8.712
3D body: height 10.01, standoff 0, extent -16.027,-5.74 -2.692,6.248
3D body: height 2.57, standoff -0.03, extent -1.507,-7.595 9.093,8.005
3D body: height 1.24, standoff -0.03, extent -12.929,-1.372 -9.627,0.152
3D body: height 12.5, standoff 0, extent -14.249,-16.713 -4.242,-6.706
3D body: height 12.5, standoff 0, extent -6.426,9.119 3.581,19.126

## SVP_PowerSupply_+5 [mm]
pads (62):
  rect 1.5x1.6 smd: 1(0.625,-9.474) 1(5.248,-17.272) 1(5.248,-14.656) 1(5.248,-12.065) 1(5.248,-9.474) 1(11.013,-5.512) 1(11.013,-1.702) 1(11.013,5.918) 1(11.013,8.534) 2(2.525,-14.681) 2(2.525,-12.09) 2(2.525,-9.474) 2(7.148,-14.656) 2(7.148,-12.065) 2(7.148,-9.474) +5(-18.171,-11.049) +5(0.625,-14.681) +5(0.625,-12.09) +12P(6.238,10.973) +12P(6.238,13.564) +12P(6.238,16.154) AGND(-16.271,-11.049) AGND(7.148,-17.272) AGND(8.138,10.973) AGND(8.138,13.564) AGND(8.138,16.154) AGND(12.913,-5.512) AGND(12.913,-1.702) AGND(12.913,5.918) AGND(12.913,8.534)
  rect 2.92x2.79 smd: 2(-6.082,1.143) +5(-21.452,1.143)
  oval 2.3x0.6 smd: 2(-0.79,5.918) 5(-0.79,2.108) 8(-0.79,-1.702) 11(-0.79,-5.512) 13(8.36,-6.782) 14(8.36,-5.512) 15(8.36,-4.242) 16(8.36,-2.972) 17(8.36,-1.702) 20(8.36,2.108) 23(8.36,5.918) 24(8.36,7.188) +12P(-0.79,-0.432) +12P(-0.79,0.838) +12P(8.36,0.838) AGND(-0.79,-6.782) AGND(-0.79,-4.242) AGND(-0.79,-2.972) AGND(-0.79,3.378) AGND(-0.79,4.648) AGND(-0.79,7.188) AGND(8.36,-0.432) AGND(8.36,3.378) AGND(8.36,4.648)
  round 1.85 hole 0.9: +5(-10.897,-18.39) +12P(1.168,13.868) AGND(-10.897,-13.39) AGND(-3.832,13.868)
  rect 1.6x1.5 smd: +5(-2.159,-14.514) AGND(-2.159,-12.614)
Top Layer:
  rectangle: 12.167,4.724 16.332,10.185
  region: -17.475,7.315 -24.536,7.315 -24.536,-14.453 -18.136,-20.853 -4.013,-20.853 1.372,-15.469 1.372,-13.894 -6.121,-13.894 -7.442,-15.215 -14.326,-15.215 -17.475,-12.065
  region: -2.464,2.972 -3.124,3.632 -8.433,3.632 -8.433,-2.692 -2.489,-2.692 -2.489,2.946
  region: 7.087,17.272 7.112,10.084 3.81,6.782 3.81,0.991 2.007,-0.813 -2.032,-0.813 -2.032,1.27 0.762,1.27 0.762,10.541 -0.762,12.065 -0.762,15.799 0.66,17.272
  region: -2.489,-2.692 -2.176,-2.3 0.45,-2.3 0.45,-1.092 -2.286,-1.092 -2.286,1.524 0.508,1.524 0.508,2.769 -2.262,2.769 -2.503,3.012
  region: -17.094,-11.806 -17.094,-7.569 -17.046,7.313 -3.353,21.006 12.09,21.006 16.332,16.789 16.332,9.601 9.83,9.601 9.83,7.925 9.652,7.772 6.909,7.772 6.909,5.334 9.83,5.334 9.83,4.826 16.332,4.826 16.307,-15.646 12.471,-19.482 7.798,-19.482 6.401,-18.085 6.401,-16.408 8.738,-16.408 9.83,-15.316 9.83,-6.604 12.167,-6.604 12.167,-4.445 9.83,-4.445 9.83,-2.769 12.167,-2.769 12.167,-0.635 9.83,-0.635 9.83,-1.118 6.909,-1.118 6.909,-2.515 5.69,-2.515 4.775,-3.429 4.775,-8.382 4.216,-8.382 4.216,-12.294 3.556,-12.294 3.556,-8.382 2.946,-8.382 2.946,-2.616 1.803,-1.499 3.683,0.381 6.909,0.381 6.909,0.254 9.83,0.254 9.83,2.718 6.909,2.718 6.909,1.295 4.064,1.295 4.064,6.604 7.391,9.931 7.391,17.526 0.533,17.526 -1.016,15.977 -1.016,11.938 0.508,10.363 0.508,6.553 -2.286,6.553 -2.286,5.334 0.508,5.334 0.508,3.023 -2.032,3.023 -2.935,4.089 -8.814,4.089 -8.814,-2.972 -2.286,-2.972 -1.905,-2.591 1.575,-2.591 2.032,-3.023 2.032,-4.902 -2.261,-4.902 -2.286,-4.877 -2.286,-6.096 0.508,-6.096 0.508,-7.442 0.203,-7.747 0.203,-8.382 -0.457,-8.382 -0.457,-13.437 -6.375,-13.437 -7.68,-14.694 -12.776,-14.681 -14.166,-14.681
  lines w0.254: 6.604,-8.915 6.604,-8.941 6.706,-8.941
  lines w0.381: -0.178,-6.731 -0.102,-6.807 ; -0.178,-5.486 0.965,-5.486 1.321,-5.842 1.321,-7.366 0.66,-8.026 0.66,-9.398 ; -0.051,0.838 8.357,0.838 ; 0.025,-1.676 1.346,-1.676 2.489,-2.819 2.489,-9.398 ; 0.635,-14.707 0.635,-12.116 ; 2.743,-14.91 3.785,-15.951 8.509,-15.951 9.373,-15.088 9.373,-8.077 8.103,-6.807 ; 2.972,-12.471 4.813,-14.313 ; 5.232,-17.196 5.232,-15.951 ; 5.232,-11.963 5.232,-9.728 ; 7.01,-9.068 7.01,-8.915 5.232,-7.137 5.232,-3.607 5.867,-2.972 8.407,-2.972 ; 7.137,-14.605 7.137,-12.421 ; 7.366,-11.963 8.357,-11.963 8.636,-11.684 8.636,-8.433 8.331,-8.128 7.442,-8.128 6.198,-6.883 6.198,-4.597 6.553,-4.242 7.645,-4.242 ; 9.195,-1.702 10.541,-1.702 ; 9.246,-5.512 10.643,-5.512 ; 9.246,5.918 10.668,5.918 ; 9.246,7.188 9.83,7.188 10.77,8.128
Top Overlay:
  circle w0.25: c-0.79,8.038 r0.125
  circle w0.6: c1.76,7.003 r0.3
  circle w0.254: c-10.897,-15.89 r5
  circle w0.254: c-1.459,14.122 r5
  lines w0.2: 0.76,-7.597 0.76,8.003 6.81,8.003 6.81,-7.597 0.76,-7.597
  lines w0.254: -9.779,-18.339 -8.204,-18.339 ; -8.992,-19.152 -8.992,-17.526 ; 0.305,15.773 1.93,15.773 ; 1.118,14.986 1.118,16.561
  text "CP12" at -19.812,-13.589 h1.02
  text "RP6" at 0.229,-17.196 h1.02
  text "RP5" at -3.734,-10.77 h1.02
  text "RP4" at 8.738,-17.805 h1.02
  text "RP3" at 8.712,-9.957 h1.02
  text "RP2" at 14.376,5.385 h1.02
  text "RP1" at 14.402,8.077 h1.02
  text "UP1" at 1.6,4.318 h1.02
  text "CP11" at -12.929,-17.45 h1.02
  text "CP10" at -2.896,17.094 h1.02
  text "CP8" at -3.734,-9.22 h1.02
  text "CP7" at 8.687,-15.138 h1.02
  text "CP6" at 8.687,-12.522 h1.02
  text "CP5" at 14.326,-5.994 h1.02
  text "CP4" at 14.326,-2.21 h1.02
  text "CP3" at 9.83,10.617 h1.02
  text "CP2" at 9.83,13.132 h1.02
  text "CP1" at 9.83,15.748 h1.02
  text "CP9" at -3.759,-16.789 h1.02
Mechanical 13:
  circle w0.254: c-13.767,1.143 r10
  circle w0.1: c0.935,7.053 r0.5
  lines w0.1: -18.321,-11.774 -16.121,-11.774 -16.121,-10.324 -18.321,-10.324 -18.321,-11.774 ; -2.884,-14.664 -1.434,-14.664 -1.434,-12.464 -2.884,-12.464 -2.884,-14.664 ; -0.015,-7.597 -0.015,8.003 7.585,8.003 7.585,-7.597 -0.015,-7.597 ; 0.475,-15.406 2.675,-15.406 2.675,-13.956 0.475,-13.956 0.475,-15.406 ; 0.475,-12.815 2.675,-12.815 2.675,-11.365 0.475,-11.365 0.475,-12.815 ; 0.475,-10.199 2.675,-10.199 2.675,-8.749 0.475,-8.749 0.475,-10.199 ; 5.098,-17.997 7.298,-17.997 7.298,-16.547 5.098,-16.547 5.098,-17.997 ; 5.098,-15.381 7.298,-15.381 7.298,-13.931 5.098,-13.931 5.098,-15.381 ; 5.098,-12.79 7.298,-12.79 7.298,-11.34 5.098,-11.34 5.098,-12.79 ; 5.098,-10.199 7.298,-10.199 7.298,-8.749 5.098,-8.749 5.098,-10.199 ; 6.088,10.248 8.288,10.248 8.288,11.698 6.088,11.698 6.088,10.248 ; 6.088,12.839 8.288,12.839 8.288,14.289 6.088,14.289 6.088,12.839 ; 6.088,15.429 8.288,15.429 8.288,16.879 6.088,16.879 6.088,15.429 ; 10.863,-6.237 13.063,-6.237 13.063,-4.787 10.863,-4.787 10.863,-6.237 ; 10.863,-2.427 13.063,-2.427 13.063,-0.977 10.863,-0.977 10.863,-2.427 ; 10.863,5.193 13.063,5.193 13.063,6.643 10.863,6.643 10.863,5.193 ; 10.863,7.809 13.063,7.809 13.063,9.259 10.863,9.259 10.863,7.809
Mechanical 15:
  lines w0.1: -17.721,-11.049 -16.721,-11.049 ; -17.221,-11.549 -17.221,-10.549 ; -2.659,-13.564 -1.659,-13.564 ; -2.159,-14.064 -2.159,-13.064 ; 1.075,-14.681 2.075,-14.681 ; 1.075,-12.09 2.075,-12.09 ; 1.075,-9.474 2.075,-9.474 ; 1.575,-15.181 1.575,-14.181 ; 1.575,-12.59 1.575,-11.59 ; 1.575,-9.974 1.575,-8.974 ; 3.285,0.203 4.285,0.203 ; 3.785,-0.297 3.785,0.703 ; 5.698,-17.272 6.698,-17.272 ; 5.698,-14.656 6.698,-14.656 ; 5.698,-12.065 6.698,-12.065 ; 5.698,-9.474 6.698,-9.474 ; 6.198,-17.772 6.198,-16.772 ; 6.198,-15.156 6.198,-14.156 ; 6.198,-12.565 6.198,-11.565 ; 6.198,-9.974 6.198,-8.974 ; 6.688,10.973 7.688,10.973 ; 6.688,13.564 7.688,13.564 ; 6.688,16.154 7.688,16.154 ; 7.188,10.473 7.188,11.473 ; 7.188,13.064 7.188,14.064 ; 7.188,15.654 7.188,16.654 ; 11.463,-5.512 12.463,-5.512 ; 11.463,-1.702 12.463,-1.702 ; 11.463,5.918 12.463,5.918 ; 11.463,8.534 12.463,8.534 ; 11.963,-6.012 11.963,-5.012 ; 11.963,-2.202 11.963,-1.202 ; 11.963,5.418 11.963,6.418 ; 11.963,8.034 11.963,9.034 ; -19.421,-12.349 -15.021,-12.349 -15.021,-9.749 -19.421,-9.749 -19.421,-12.349 ; -3.459,-15.764 -0.859,-15.764 -0.859,-11.364 -3.459,-11.364 -3.459,-15.764 ; -2.19,-7.847 -2.19,8.253 9.76,8.253 9.76,-7.847 -2.19,-7.847 ; -0.625,-15.981 3.775,-15.981 3.775,-13.381 -0.625,-13.381 -0.625,-15.981 ; -0.625,-13.39 3.775,-13.39 3.775,-10.79 -0.625,-10.79 -0.625,-13.39 ; -0.625,-10.774 3.775,-10.774 3.775,-8.174 -0.625,-8.174 -0.625,-10.774 ; 3.998,-18.572 8.398,-18.572 8.398,-15.972 3.998,-15.972 3.998,-18.572 ; 3.998,-15.956 8.398,-15.956 8.398,-13.356 3.998,-13.356 3.998,-15.956 ; 3.998,-13.365 8.398,-13.365 8.398,-10.765 3.998,-10.765 3.998,-13.365 ; 3.998,-10.774 8.398,-10.774 8.398,-8.174 3.998,-8.174 3.998,-10.774 ; 4.988,9.673 9.388,9.673 9.388,12.273 4.988,12.273 4.988,9.673 ; 4.988,12.264 9.388,12.264 9.388,14.864 4.988,14.864 4.988,12.264 ; 4.988,14.854 9.388,14.854 9.388,17.454 4.988,17.454 4.988,14.854 ; 9.763,-6.812 14.163,-6.812 14.163,-4.212 9.763,-4.212 9.763,-6.812 ; 9.763,-3.002 14.163,-3.002 14.163,-0.402 9.763,-0.402 9.763,-3.002 ; 9.763,4.618 14.163,4.618 14.163,7.218 9.763,7.218 9.763,4.618 ; 9.763,7.234 14.163,7.234 14.163,9.834 9.763,9.834 9.763,7.234
3D body: height 1.24, standoff -0.03, extent -18.872,-11.811 -15.57,-10.287
3D body: height 2.57, standoff -0.03, extent -1.507,-7.595 9.093,8.005
3D body: height 1.24, standoff -0.03, extent -0.076,-10.236 3.226,-8.712
3D body: height 0.5, standoff -0.01, extent 0.051,-12.852 3.099,-11.328
3D body: height 0.5, standoff -0.01, extent 0.051,-15.443 3.099,-13.919
3D body: height 0.5, standoff -0.01, extent 4.674,-18.034 7.722,-16.51
3D body: height 0.5, standoff -0.01, extent 4.674,-10.236 7.722,-8.712
3D body: height 0.5, standoff -0.01, extent 10.439,5.156 13.487,6.68
3D body: height 0.5, standoff -0.01, extent 10.439,7.772 13.487,9.296
3D body: height 1.24, standoff -0.03, extent -2.921,-15.215 -1.397,-11.913
3D body: height 1.24, standoff -0.03, extent 4.547,-15.418 7.849,-13.894
3D body: height 1.24, standoff -0.03, extent 4.547,-12.827 7.849,-11.303
3D body: height 1.24, standoff -0.03, extent 10.312,-6.274 13.614,-4.75
3D body: height 1.24, standoff -0.03, extent 10.312,-2.464 13.614,-0.94
3D body: height 1.24, standoff -0.03, extent 5.537,10.211 8.839,11.735
3D body: height 1.24, standoff -0.03, extent 5.537,12.802 8.839,14.326
3D body: height 1.24, standoff -0.03, extent 5.537,15.392 8.839,16.916
3D body: height 12.5, standoff 0, extent -6.426,9.119 3.581,19.126
3D body: height 12.5, standoff 0, extent -15.926,-20.853 -5.918,-10.846